# Altium footprint library Selex_PCBLib.PcbLib: 388 footprints (part 2 of 25)
Each footprint in its own frame and in the unit in brackets; x right, y up, seen from the top. Pads: shape width x height; smd on the part's side, far side on the other; paste and mask are expansions set on the pad; w line width, h text height; cw(c..) or ccw(c..) is an arc to the next point about the centre after c.
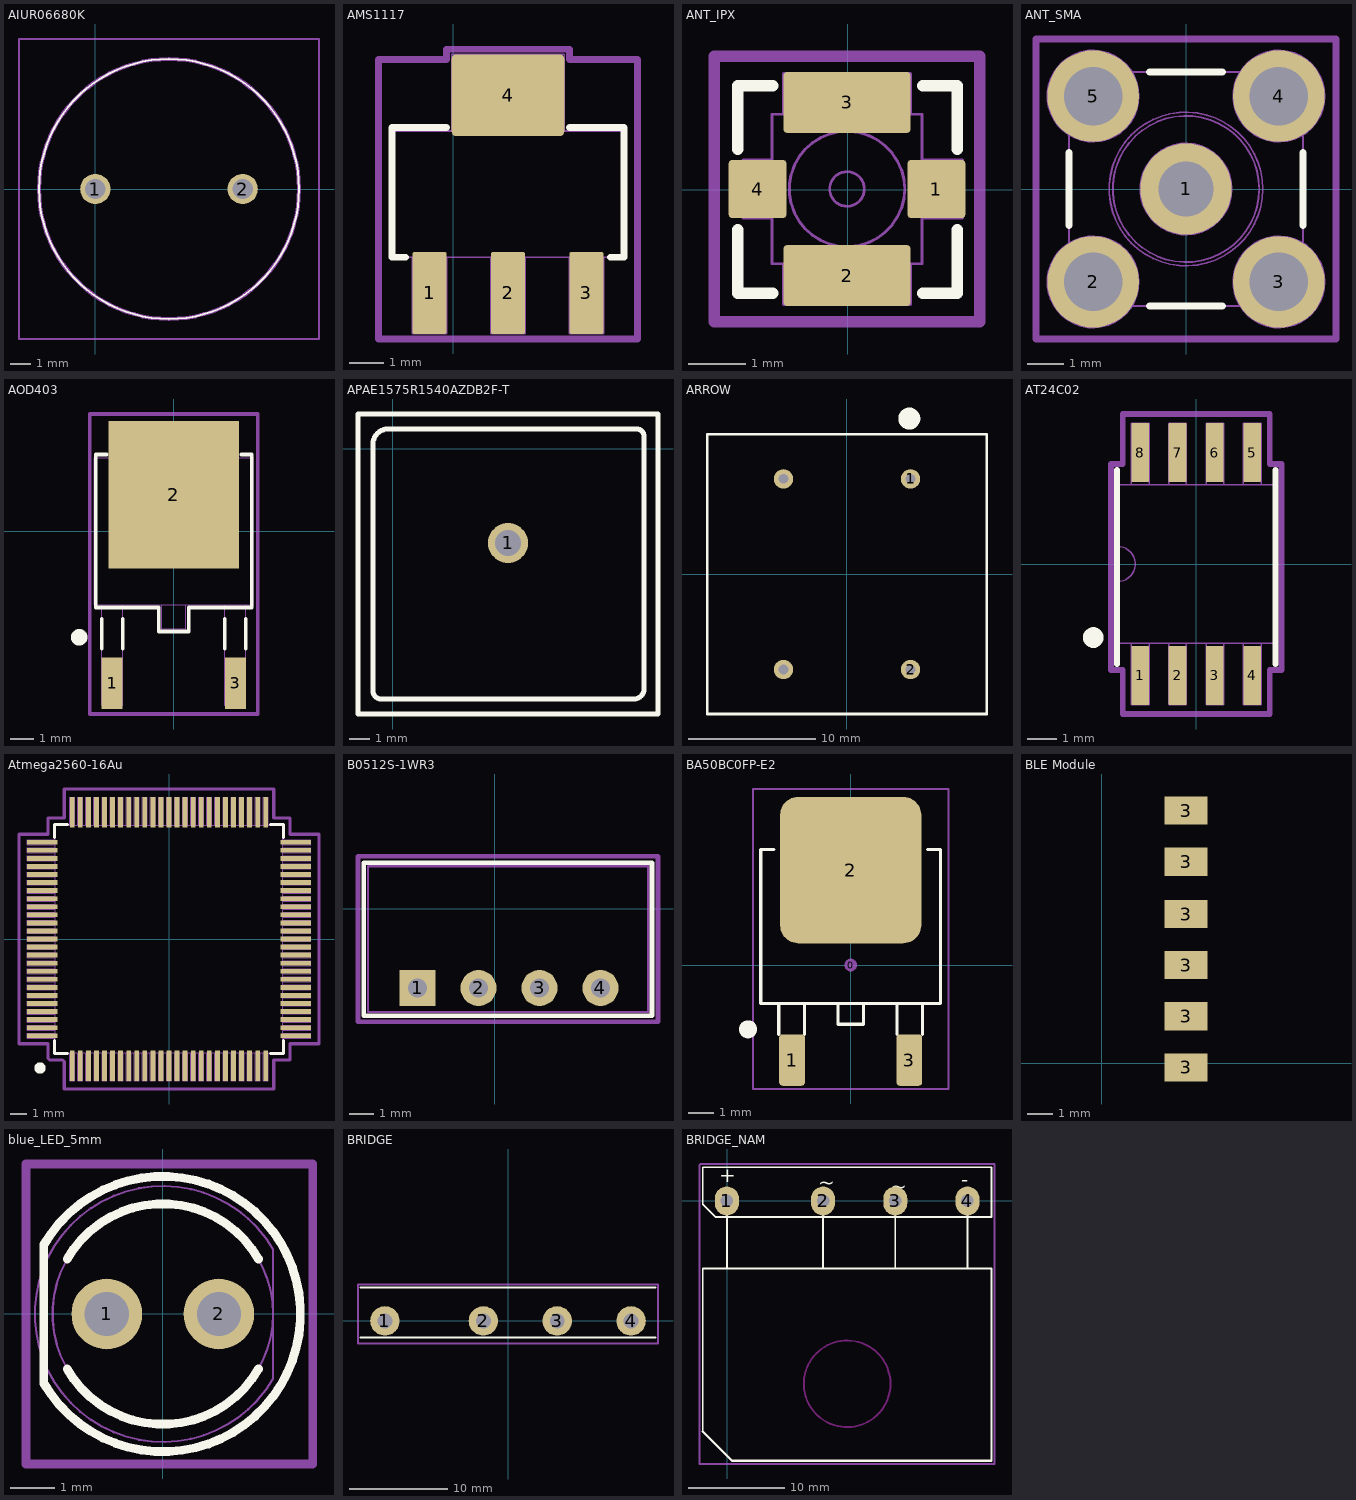
[diagram p1: the footprints below, top view; thin cyan lines are the x and y axes]

## AIUR06680K [mm]
pads (2):
  round 1.515 hole 1.01: 1(0,0) 2(7.37,0)
Top Overlay:
  lines w0.1: -2.815,0 cw(c3.685,0) 10.185,0 cw(c3.685,0) -2.815,0
Mechanical 13:
  lines w0.2: -2.815,0 cw(c3.685,0) 10.185,0 cw(c3.685,0) -2.815,0
Mechanical 15:
  lines w0.1: -3.815,-7.5 11.185,-7.5 11.185,7.5 -3.815,7.5 -3.815,-7.5
3D body "AIUR-06-680K.stp": height 18.13, standoff -5, extent -2.815,-6.5 10.185,6.5

## AMS1117 [mm] "SOT223, 4-Leads, Body 6.7x7.3mm (max), Pitch 2.30mm, IPC Medium Density"
height 1.8
pads (4):
  rrect10% 1x2.4 smd mask+0.05: 1(-0.7,7.85) 2(1.6,7.85) 3(3.9,7.85)
  rrect10% 3.3x2.4 smd mask+0.05: 4(1.6,13.65)
Top Overlay:
  lines w0.2: -1.4,8.9 -1.8,8.9 -1.8,12.7 -0.2,12.7 ; 3.4,12.7 5,12.7 5,8.9 4.6,8.9
Mechanical 1:
  lines w0.05: -1.2,6.65 -0.2,6.65 ; -1.2,6.65 -1.2,8.9 ; -1.2,6.65 -1.2,8.9 ; -1.2,6.65 -0.2,6.65 ; -1.2,8.9 -0.2,8.9 ; -1.2,8.9 -0.2,8.9 ; -0.2,6.65 -0.2,8.9 ; -0.2,6.65 -0.2,8.9 ; -1.75,8.9 4.95,8.9 4.95,12.6 -1.75,12.6 -1.75,8.9 ; -0.05,12.6 -0.05,14.85 3.25,14.85 3.25,12.6 -0.05,12.6 ; 1.1,6.65 2.1,6.65 2.1,8.9 1.1,8.9 1.1,6.65 ; 3.4,6.65 4.4,6.65 4.4,8.9 3.4,8.9 3.4,6.65
  text "1" at -0.8,9.4 h0.8
  text "2" at 1.3,9.4 h0.8
  text "3" at 3.65,9.4 h0.8
Mechanical 15:
  lines w0.2: 5.4,7 5.4,6.5 -2.2,6.5 -2.2,8.5 -2.2,14.7 -0.2,14.7 -0.2,15 3.4,15 3.4,14.7 5.4,14.7 5.4,8.5 5.4,8
  lines w0.21: 5.4,7 5.4,8
3D body "User Library-AMS1117.step": height 1.85, standoff -0.01, extent -1.6,7.3 4.9,14.3

## ANT_IPX [mm]
pads (4):
  rrect10% 1x1 smd mask+0.05: 1(1.54,0.01) 4(-1.56,0.01)
  rrect10% 2.2x1.05 smd mask+0.05: 2(-0.01,-1.49) 3(-0.01,1.51)
Top Overlay:
  lines w0.2: -1.9,-0.7 -1.9,-1.8 -1.3,-1.8 ; -1.9,0.7 -1.9,1.8 -1.3,1.8 ; 1.3,-1.8 1.9,-1.8 1.9,-0.7 ; 1.3,1.8 1.9,1.8 1.9,0.7
Mechanical 1:
  circle w0.05: c-0.01,0.01 r0.3
  circle w0.05: c-0.01,0.01 r1
  lines w0.05: -1.31,-0.49 -1.81,-0.49 -1.81,0.51 -1.31,0.51 ; -1.31,-1.285 -1.31,1.305 1.29,1.305 1.29,-1.285 -1.31,-1.285 ; -1.11,-1.99 1.09,-1.99 1.09,-1.285 -1.11,-1.285 -1.11,-1.99 ; -1.11,1.305 -1.11,2.01 1.09,2.01 1.09,1.305 -1.11,1.305 ; 1.29,-0.49 1.29,0.51 1.99,0.51 1.99,-0.49 1.29,-0.49
Mechanical 15:
  lines w0.2: -2.31,-2.29 -2.31,2.31 2.29,2.31 2.29,-2.29 -2.31,-2.29
3D body "IPX.step": height 1.2, standoff -0.08, extent -1.31,-1.49 1.54,1.51

## ANT_SMA [mm]
pads (5):
  round 2.5 hole 1.5 mask+0.1: 1(0,0)
  round 2.5 hole 1.6 mask+0.1: 2(-2.54,-2.54) 3(2.54,-2.54) 4(2.54,2.54) 5(-2.54,2.54)
Top Overlay:
  lines w0.2: -3.2,-1 -3.2,1 ; -1,-3.2 1,-3.2 ; -1,3.2 1,3.2 ; 3.2,-1 3.2,1
Mechanical 1:
  circle w0.05: c-2.54,2.54 r1.25
  circle w0.05: c2.54,2.54 r1.25
  circle w0.05: c0,0 r1.25
  circle w0.05: c2.54,-2.54 r1.25
  circle w0.05: c-2.54,-2.54 r1.25
  circle w0.05: c0,0 r0.5
  circle w0.05: c0,0 r2.1
  circle w0.05: c0,0 r2
  lines w0.05: -3.2,-3.2 -3.2,3.2 3.2,3.2 3.2,-3.2 -3.2,-3.2
Mechanical 15:
  lines w0.2: -4.1,-4.1 4.1,-4.1 4.1,4.1 -4.1,4.1 -4.1,-4.1
3D body "SMA.step": height 9.72, standoff -3.81, extent -3.175,-3.175 3.175,3.175

## AOD403 [mil]
pads (3):
  rect 35x86 smd paste+0 mask+0: 1(-102.56,-253.5) 3(102.56,-253.5)
  rect 217x246 smd paste+0 mask+0: 2(0,60.5)
Top Overlay:
  circle w19.68: c-157.48,-177.17 r3.94
  lines w6: -120.06,-196.5 -120.06,-146.5 ; -111.6,127.5 -130,127.5 -130,-127.5 -25,-127.5 -25,-167.5 25,-167.5 25,-127.5 130,-127.5 130,127.5 ; -85.06,-196.5 -85.06,-146.5 ; 85.06,-196.5 85.06,-146.5 ; 112.5,127.5 128.4,127.5 ; 120.06,-196.5 120.06,-146.5
Mechanical 13:
  lines w1: -132.5,-122.5 132.5,-122.5 132.5,122.5 -132.5,122.5 -132.5,-122.5 ; -120.06,-290.5 -120.06,-122.5 -85.06,-122.5 -85.06,-290.5 -120.06,-290.5 ; -20,-162.5 -20,-122.5 20,-122.5 20,-162.5 -20,-162.5 ; 85.06,-290.5 85.06,-122.5 120.06,-122.5 120.06,-290.5 85.06,-290.5
Mechanical 15:
  lines w6: -140,-305 -140,195 140,195 140,-131.5 140,-305 -140,-305
3D body: height 10, standoff 0, extent 0,0 10,10
3D body "PG-TO252-3_INF.step": height 95.12, standoff -2.01, extent -132.51,-290.5 132.52,172.53

## APAE1575R1540AZDB2F-T [mm]
pads (1):
  round 2 hole 1.3: 1(5.75,-4.7)
Top Overlay:
  lines w0.254: -1.75,-5.75 -1.75,1.75 ; -1.75,1.75 -1.75,-13.25 13.25,-13.25 13.25,1.75 -1.75,1.75 ; -1,-12.1 ccw(c-0.6,-12.1) -0.6,-12.5 12.05,-12.5 ccw(c12.05,-12) 12.55,-12 12.55,0.65 ccw(c12.2,0.65) 12.2,1 -0.25,1 ccw(c-0.25,0.25) -1,0.25 -1,-12.1

## ARROW [mil]
pads (4):
  round 60 hole 30: 1(196.85,295.28) 2(196.85,-295.28) ""(-196.85,-295.28) ""(-196.85,295.28)
Top Overlay:
  circle w39.37: c193,482 r14.32
  lines w7.87: -433.07,-433.07 -433.07,433.07 433.07,433.07 433.07,-433.07 -433.07,-433.07
3D body "Part4.STEP": height 362.2, standoff -307.09, extent -432.08,-438.07 434.06,428.07

## AT24C02 [mm] "SMD,"
height 2.16
pads (8):
  rrect10% 0.6x2 smd mask+0.1: 1(-1.905,-3.79) 2(-0.635,-3.79) 3(0.635,-3.79) 4(1.905,-3.79) 5(1.905,3.79) 6(0.635,3.79) 7(-0.635,3.79) 8(-1.905,3.79)
Top Overlay:
  circle w0.5: c-3.5,-2.5 r0.1
  lines w0.2: -2.7,-3.4 -2.7,3.2 ; 2.7,-3.4 2.7,3.2
Mechanical 1:
  lines w0.05: -2.675,-0.6 ccw(c-2.675,0) -2.675,0.6 ; -2.205,-4.79 -1.605,-4.79 ; -2.205,-4.79 -2.205,-2.7 ; -2.205,-4.79 -2.205,-2.7 ; -2.205,-4.79 -1.605,-4.79 ; -2.205,-2.7 -1.605,-2.7 ; -2.205,-2.7 -1.605,-2.7 ; -1.605,-4.79 -1.605,-2.7 ; -1.605,-4.79 -1.605,-2.7 ; 1.605,2.7 1.605,4.79 ; 1.605,2.7 2.205,2.7 ; 1.605,2.7 2.205,2.7 ; 1.605,2.7 1.605,4.79 ; 1.605,4.79 2.205,4.79 ; 1.605,4.79 2.205,4.79 ; 2.205,2.7 2.205,4.79 ; 2.205,2.7 2.205,4.79 ; -2.675,-2.7 2.675,-2.7 2.675,2.7 -2.675,2.7 -2.675,-2.7 ; -2.205,2.7 -2.205,4.79 -1.605,4.79 -1.605,2.7 -2.205,2.7 ; -0.935,-4.79 -0.935,-2.7 -0.335,-2.7 -0.335,-4.79 -0.935,-4.79 ; -0.935,2.7 -0.935,4.79 -0.335,4.79 -0.335,2.7 -0.935,2.7 ; 0.335,-4.79 0.335,-2.7 0.935,-2.7 0.935,-4.79 0.335,-4.79 ; 0.335,2.7 0.335,4.79 0.935,4.79 0.935,2.7 0.335,2.7 ; 1.605,-4.79 1.605,-2.7 2.205,-2.7 2.205,-4.79 1.605,-4.79
Mechanical 15:
  lines w0.2: -2.9,-3.6 -2.5,-3.6 -2.5,-5.1 2.5,-5.1 2.5,-3.6 2.9,-3.6 2.9,3.4 2.5,3.4 2.5,5.1 -2.5,5.1 -2.5,3.4 -2.9,3.4 -2.9,2.9 -2.9,-3.6
3D body "User Library-SO-8W.STEP": height 1.95, standoff 0, extent -2.65,-3.95 2.65,3.95

## Atmega2560-16Au [mm] "100A, TQFP"
height 1.2
pads (100):
  rrect10% 0.3x1.9 smd mask+0.05: 1(-6,-7.85) 2(-5.5,-7.85) 3(-5,-7.85) 4(-4.5,-7.85) 5(-4,-7.85) 6(-3.5,-7.85) 7(-3,-7.85) 8(-2.5,-7.85) 9(-2,-7.85) 10(-1.5,-7.85) 11(-1,-7.85) 12(-0.5,-7.85) 13(0,-7.85) 14(0.5,-7.85) 15(1,-7.85) 16(1.5,-7.85) 17(2,-7.85) 18(2.5,-7.85) 19(3,-7.85) 20(3.5,-7.85) 21(4,-7.85) 22(4.5,-7.85) 23(5,-7.85) 24(5.5,-7.85) 25(6,-7.85) 51(6,7.85) 52(5.5,7.85) 53(5,7.85) 54(4.5,7.85) 55(4,7.85) 56(3.5,7.85) 57(3,7.85) 58(2.5,7.85) 59(2,7.85) 60(1.5,7.85) 61(1,7.85) 62(0.5,7.85) 63(0,7.85) 64(-0.5,7.85) 65(-1,7.85) 66(-1.5,7.85) 67(-2,7.85) 68(-2.5,7.85) 69(-3,7.85) 70(-3.5,7.85) 71(-4,7.85) 72(-4.5,7.85) 73(-5,7.85) 74(-5.5,7.85) 75(-6,7.85)
  rrect10% 1.9x0.3 smd mask+0.05: 26(7.85,-6) 27(7.85,-5.5) 28(7.85,-5) 29(7.85,-4.5) 30(7.85,-4) 31(7.85,-3.5) 32(7.85,-3) 33(7.85,-2.5) 34(7.85,-2) 35(7.85,-1.5) 36(7.85,-1) 37(7.85,-0.5) 38(7.85,0) 39(7.85,0.5) 40(7.85,1) 41(7.85,1.5) 42(7.85,2) 43(7.85,2.5) 44(7.85,3) 45(7.85,3.5) 46(7.85,4) 47(7.85,4.5) 48(7.85,5) 49(7.85,5.5) 50(7.85,6) 76(-7.85,6) 77(-7.85,5.5) 78(-7.85,5) 79(-7.85,4.5) 80(-7.85,4) 81(-7.85,3.5) 82(-7.85,3) 83(-7.85,2.5) 84(-7.85,2) 85(-7.85,1.5) 86(-7.85,1) 87(-7.85,0.5) 88(-7.85,0) 89(-7.85,-0.5) 90(-7.85,-1) 91(-7.85,-1.5) 92(-7.85,-2) 93(-7.85,-2.5) 94(-7.85,-3) 95(-7.85,-3.5) 96(-7.85,-4) 97(-7.85,-4.5) 98(-7.85,-5) 99(-7.85,-5.5) 100(-7.85,-6)
Top Overlay:
  circle w0.5: c-8,-8 r0.1
  lines w0.2: -7.1,-6.3 -7.1,-7.1 -6.3,-7.1 ; -7.1,6.3 -7.1,7.1 -6.3,7.1 ; 6.3,-7.1 7.1,-7.1 7.1,-6.3 ; 6.3,7.1 7.1,7.1 7.1,6.3
Mechanical 1:
  drawing of 420 lines, arcs and shapes, not listed
  text "1" at -6.2,-6.8 h0.8
  text "25" at 4.5,-6.7 h0.8
  text "26" at 6.6,-5.7 h0.8
  text "50" at 6.5,4.3 h0.8
  text "51" at 4.6,5.9 h0.8
  text "100" at -5.8,-5.7 h0.8
  text "76" at -5.7,4.1 h0.8
  text "75" at -5.8,5.8 h0.8
Mechanical 7:
  lines w0.2: -9.3,-6.5 -9.3,6.5 ; -6.5,-9.3 6.5,-9.3 ; -6.5,9.3 6.5,9.3 ; 9.3,-6.5 9.3,6.5
Mechanical 15:
  lines w0.2: -9.3,-6.5 -7.5,-6.5 -7.5,-7.4 -7.4,-7.5 -6.6,-7.5 -6.5,-7.6 -6.5,-9.3 ; -9.3,6.5 -7.5,6.5 -7.5,7.5 -6.5,7.5 -6.5,9.3 ; 6.5,-9.3 6.5,-7.5 7.5,-7.5 7.5,-6.5 9.3,-6.5 ; 6.5,9.3 6.5,7.5 7.5,7.5 7.5,6.5 9.3,6.5
3D body "User Library-100A-14x14.step": height 1, standoff -0.1, extent -8,-8 8,8

## B0512S-1WR3 [mm]
pads (4):
  rect 1.5x1.5 hole 0.8: 1(-3.217,-3.291)
  round 1.5 hole 0.8: 2(-0.677,-3.291) 3(1.863,-3.291) 4(4.403,-3.291)
Top Overlay:
  lines w0.2: -5.461,-4.445 -5.461,1.93 6.553,1.93 6.553,-4.445 -5.461,-4.445
Mechanical 13:
  lines w0.1: -5.283,-4.293 -5.283,1.778 6.401,1.778 6.401,-4.293 -5.283,-4.293
Mechanical 15:
  lines w0.2: -5.7,-4.7 -5.7,2.2 6.8,2.184 ; -5.7,-4.697 -2.159,-4.697 6.8,-4.7 6.8,2.2
3D body "MORNSUN_BxxxxS-1WR3.step": height 10.16, standoff -4.1, extent -5.292,-4.191 6.308,1.809

## BA50BC0FP-E2 [mm]
pads (4):
  round 0.5 on Mech15: 0(0,0)
  rrect25% 1x2 smd: 1(-2.285,-3.7) 3(2.285,-3.7)
  rrect25% 5.5x5.7 smd: 2(0,3.7)
Top Overlay:
  circle w0.5: c-4,-2.5 r0.1
  lines w0.127: -3,4.5 -3.5,4.5 -3.5,-1.5 3.5,-1.5 3.5,4.5 3,4.5 ; -2.8,-2.7 -2.8,-1.5 -1.8,-1.5 -1.8,-2.7 ; 1.8,-2.7 1.8,-1.5 2.8,-1.5 2.8,-2.7 ; -0.5,-2.3 -0.5,-1.5 0.5,-1.5 0.5,-2.3 -0.5,-2.3
Mechanical 15:
  lines w0.076: -3.81,-4.826 -3.81,6.858 3.81,6.858 3.81,-4.826 -3.81,-4.826
3D body "DPAK.stp": height 2.31, standoff 0, extent -3.3,-3.951 3.3,5.762

## BA252 [mm]

## BLE Module [mm]
pads (6):
  rect 1.7x1.1 smd: 3(3.3,-0.15) 3(3.3,1.85) 3(3.3,3.85) 3(3.3,5.85) 3(3.3,7.9) 3(3.3,9.9)

## blue_LED_5mm [mm]
pads (2):
  round 1.6 hole 1: 1(-1.27,0) 2(1.27,0)
Top Overlay:
  lines w0.2: -2.7,-1.572 -2.7,1.572 ; -2.696,-1.57 ccw(c0,0) -2.696,1.57 ; -2.165,-1.25 ccw(c0,0) 2.165,-1.25 ; -2.165,1.25 cw(c0,0) 2.165,1.25
Mechanical 1:
  circle w0.05: c0,0 r2.5
  lines w0.05: 2.5,-1.47 cw(c0,0) 2.5,1.47 ; 2.5,-1.47 2.5,1.47
Mechanical 15:
  lines w0.2: -3.1,-3.4 3.4,-3.4 3.4,3.4 -3.1,3.4 -3.1,-3.4
3D body "ALSRobot-LED-RGB 5mm.step": height 9.85, standoff -2.85, extent -2.9,-2.9 2.5,2.9

## BRIDGE [mm]
pads (4):
  round 3 hole 1.5: 1(-12.5,0) 2(-2.5,0) 3(5,0) 4(12.5,0)
Top Overlay:
  lines w0.2: -15,-1.7 15,-1.7 ; -15,3.4 15,3.4
Mechanical 15:
  lines w0.2: -15.24,-2.3 -15.24,3.708 15.24,3.708 15.24,-2.3 -15.24,-2.3
3D body "User Library-Silicon Bridge Rectifiers KBJ1001.STEP": height 23.85, standoff -13.35, extent -15.025,-1.396 14.975,3.404

## BRIDGE_NAM [mm]
pads (4):
  oval 2.5x3 hole 1.3: 1(-0.025,-0.025) 2(9.975,-0.025) 3(17.475,-0.025) 4(24.975,-0.025)
Top Overlay:
  lines w0.2: -2.525,-23.975 -2.525,-7.075 ; -2.525,-7.025 27.475,-7.025 27.475,-27.025 ; -0.325,-1.675 -1.225,-1.675 ; -0.025,-7.025 -0.025,-0.025 ; 9.975,-7.025 9.975,-0.025 ; 17.475,-7.025 17.475,-0.025 ; 24.975,-6.925 24.975,-0.025 ; -1.225,-1.675 27.475,-1.675 27.475,3.475 -2.525,3.475 -2.525,-0.375 -1.225,-1.675
  lines w0.25: -2.525,-23.975 0.525,-27.025 27.475,-27.025
  text "+" at -0.813,1.905 h1.5
  text "-" at 24.333,1.499 h1.5
  text "~" at 9.449,1.194 h1.5
  text "~" at 16.967,0.787 h1.5
Keep-Out Layer:
  circle w0.2: c12.475,-19.025 r4.5
Mechanical 15:
  lines w0.2: -2.845,3.734 -2.845,-27.356 27.762,-27.356 27.762,3.81 -2.769,3.81